# Altium footprint library PCBLIB.PcbLib: 775 footprints (part 7 of 49)
Each footprint in its own frame and in the unit in brackets; x right, y up, seen from the top. Pads: shape width x height; smd on the part's side, far side on the other; paste and mask are expansions set on the pad; w line width, h text height; cw(c..) or ccw(c..) is an arc to the next point about the centre after c.
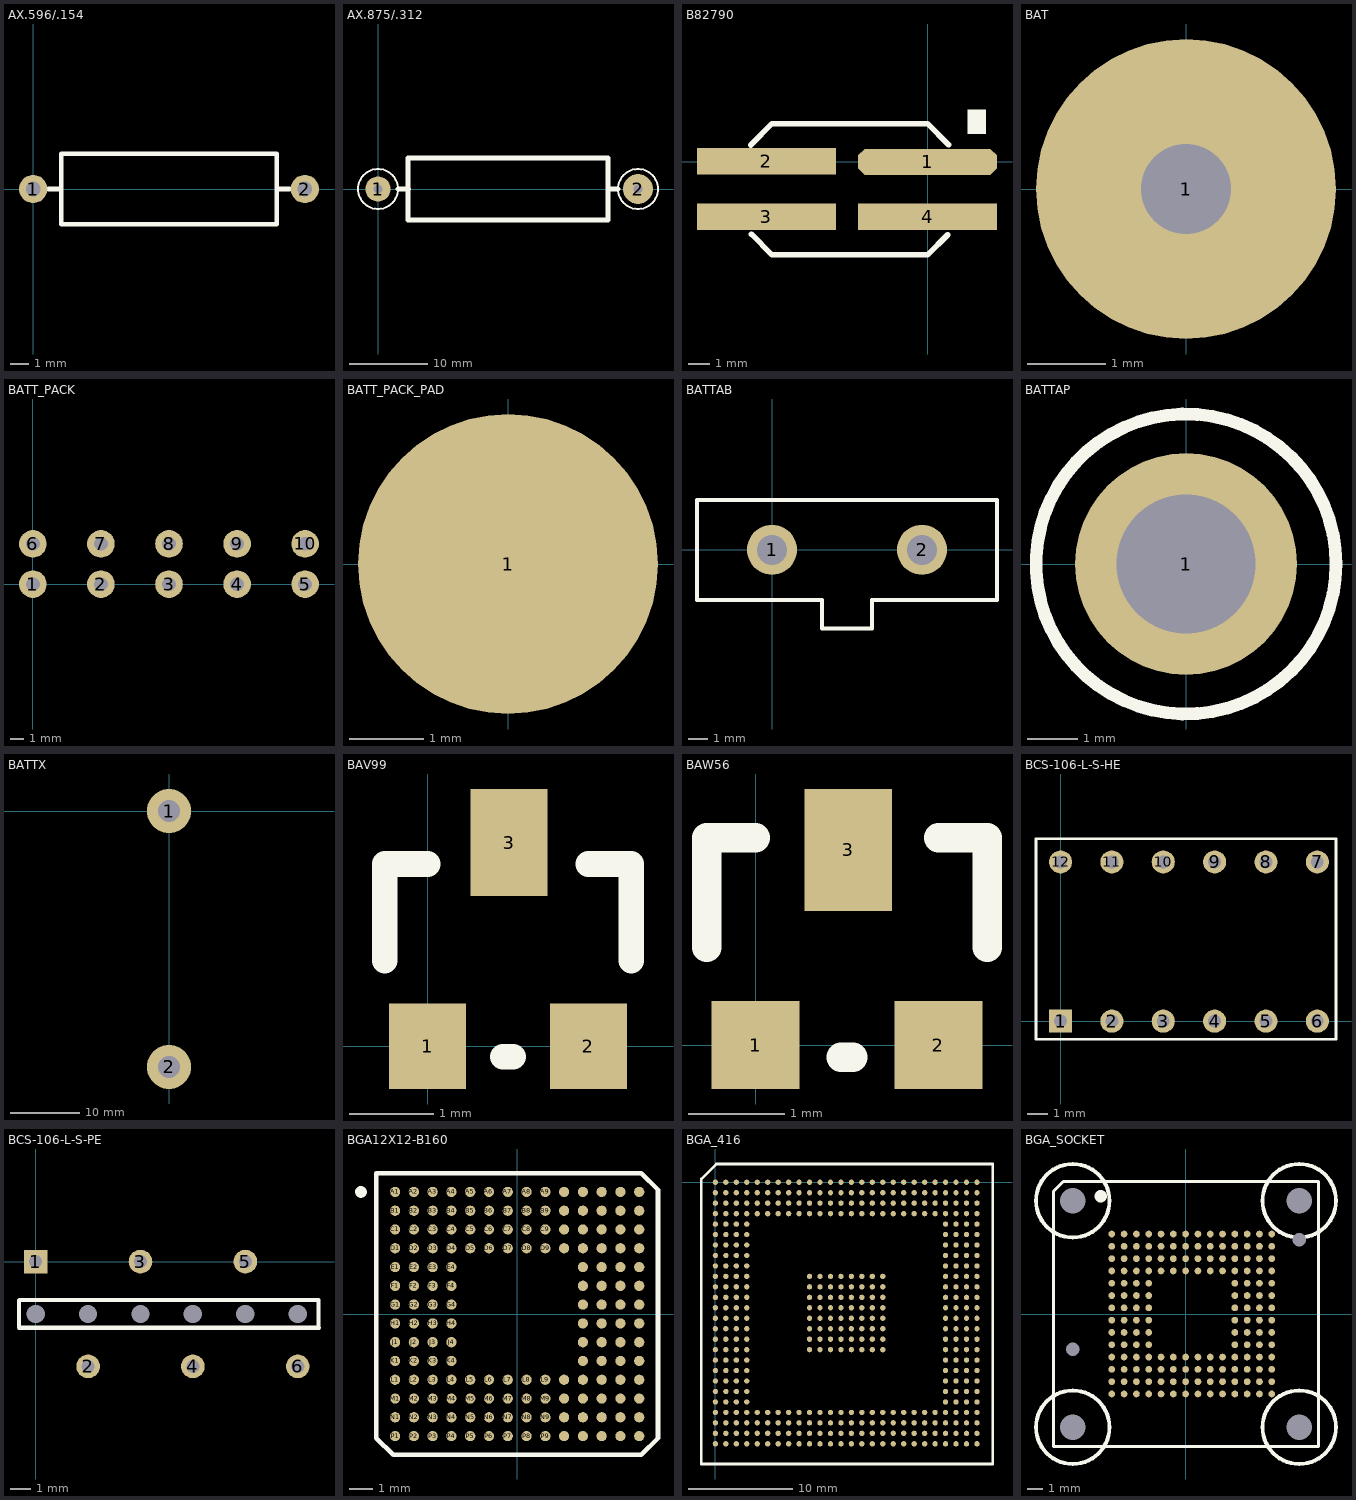
[diagram p6: the footprints below, top view; thin cyan lines are the x and y axes]

## AX.596/.154 [mil]
pads (2):
  round 62 hole 32: 1(0,0) 2(596,0)
TopOverlay:
  lines w10: 33,0 62,0 ; 534,0 563,0 ; 62,0 62,-77 534,-77 534,77 62,77 62,0

## AX.875/.312 [mil]
pads (2):
  round 125.98 hole 47: 1(0,0)
  round 150 hole 47: 2(1300,0)
TopOverlay:
  circle w10: c1300,0 r100
  circle w10: c0,0 r100
  lines w25: 100,0 152.14,0 ; 1150.77,0 1200,0 ; 150,-156 1150,-156 1150,156 150,156 150,-156

## B82790 [mm]
pads (4):
  oct 6.35x1.2 smd: 1(0,0)
  rect 6.35x1.2 smd: 2(-7.36,0.025) 3(-7.36,-2.5) 4(0,-2.5)
TopOverlay:
  rectangle: 1.829,1.269 2.681,2.388
  lines w0.254: -8.077,0.773 -7.1,1.75 0,1.75 0.965,0.785 ; -8.048,-3.302 -7.1,-4.25 0,-4.25 0.923,-3.327

## BAT [mil]
pads (1):
  round 150 hole 45: 1(0,0)

## BATT_PACK [mil]
pads (10):
  round 80 hole 40.16: 1(0,0) 2(197,0) 3(394,0) 4(591,0) 5(788,0) 6(0,117) 7(197,117) 8(394,117) 9(591,117) 10(788,117)

## BATT_PACK_PAD [mil]
pads (1):
  round 160 smd: 1(0,0)

## BATTAB [mil]
pads (2):
  round 100 hole 60: 1(0,0) 2(300,0)
TopOverlay:
  lines w8: -150,-100 -99,-100 100,-100 100,-157 200,-157 200,-100 450,-100 450,100 -150,100 -150,-100
Mechanical4:
  text "1.286" at 0,0 h1

## BATTAP [mil]
pads (1):
  round 175 hole 110: 1(0,0)
TopOverlay:
  circle w10: c0,0 r118.41

## BATTX [mil]
pads (2):
  round 250 hole 125: 1(0,0) 2(0,-1445)
Mechanical4:
  text "1.286" at 0,0 h1

## BAV99 [mil]
pads (3):
  rect 36x40 smd: 1(0,0) 2(75,0)
  rect 36x50 smd: 3(38,95)
TopOverlay:
  lines w12: -20,40 -20,85 0,85 ; 35,-5 40,-5 ; 75,85 95,85 95,40

## BAW56 [mil]
pads (3):
  rect 36x36 smd: 1(0,0) 2(75,0)
  rect 36x50 smd: 3(38,80)
TopOverlay:
  lines w12: -20,40 -20,85 0,85 ; 35,-5 40,-5 ; 75,85 95,85 95,40

## BCS-106-L-S-HE [mil]
height 10
pads (12):
  rect 45x45 hole 25: 1(0,0)
  round 45 hole 25: 2(100,0) 3(200,0) 4(300,0) 5(400,0) 6(500,0) 7(500,310) 8(400,310) 9(300,310) 10(200,310) 11(100,310) 12(0,310)
TopOverlay:
  lines w5: -47.82,355 -47.82,-35 536.37,-35 536.37,355 -46.88,355

## BCS-106-L-S-PE [mil]
height 290.16
pads (12):
  rect 45x45 hole 25: 1(0,0)
  round 45 hole 25: 2(100,-200) 3(200,0) 4(300,-200) 5(400,0) 6(500,-200)
  rect 1x1 hole 35: MH(0,-100)
  round 1 hole 35: MH(100,-100) MH(200,-100) MH(300,-100) MH(400,-100) MH(500,-100)
TopOverlay:
  lines w8: -31.73,-126.39 -31.73,-73.99 -30.88,-73.14 539.64,-73.14 539.64,-125.55 540.48,-126.39 -31.73,-126.39

## BGA12X12-B160 [mm]
height 3.937
pads (160):
  round 0.437 smd: A1(-5.2,5.2) A2(-4.4,5.2) A3(-3.6,5.2) A4(-2.8,5.2) A5(-2,5.2) A6(-1.2,5.2) A7(-0.4,5.2) A8(0.4,5.2) A9(1.2,5.2) A10(2,5.2) A11(2.8,5.2) A12(3.6,5.2) A13(4.4,5.2) A14(5.2,5.2) B1(-5.2,4.4) B2(-4.4,4.4) B3(-3.6,4.4) B4(-2.8,4.4) B5(-2,4.4) B6(-1.2,4.4) B7(-0.4,4.4) B8(0.4,4.4) B9(1.2,4.4) B10(2,4.4) B11(2.8,4.4) B12(3.6,4.4) B13(4.4,4.4) B14(5.2,4.4) C1(-5.2,3.6) C2(-4.4,3.6) C3(-3.6,3.6) C4(-2.8,3.6) C5(-2,3.6) C6(-1.2,3.6) C7(-0.4,3.6) C8(0.4,3.6) C9(1.2,3.6) C10(2,3.6) C11(2.8,3.6) C12(3.6,3.6) C13(4.4,3.6) C14(5.2,3.6) D1(-5.2,2.8) D2(-4.4,2.8) D3(-3.6,2.8) D4(-2.8,2.8) D5(-2,2.8) D6(-1.2,2.8) D7(-0.4,2.8) D8(0.4,2.8) D9(1.2,2.8) D10(2,2.8) D11(2.8,2.8) D12(3.6,2.8) D13(4.4,2.8) D14(5.2,2.8) E1(-5.2,2) E2(-4.4,2) E3(-3.6,2) E4(-2.8,2) E11(2.8,2) E12(3.6,2) E13(4.4,2) E14(5.2,2) F1(-5.2,1.2) F2(-4.4,1.2) F3(-3.6,1.2) F4(-2.8,1.2) F11(2.8,1.2) F12(3.6,1.2) F13(4.4,1.2) F14(5.2,1.2) G1(-5.2,0.4) G2(-4.4,0.4) G3(-3.6,0.4) G4(-2.8,0.4) G11(2.8,0.4) G12(3.6,0.4) G13(4.4,0.4) G14(5.2,0.4) H1(-5.2,-0.4) H2(-4.4,-0.4) H3(-3.6,-0.4) H4(-2.8,-0.4) H11(2.8,-0.4) H12(3.6,-0.4) H13(4.4,-0.4) H14(5.2,-0.4) J1(-5.2,-1.2) J2(-4.4,-1.2) J3(-3.6,-1.2) J4(-2.8,-1.2) J11(2.8,-1.2) J12(3.6,-1.2) J13(4.4,-1.2) J14(5.2,-1.2) K1(-5.2,-2) K2(-4.4,-2) K3(-3.6,-2) K4(-2.8,-2) K11(2.8,-2) K12(3.6,-2) K13(4.4,-2) K14(5.2,-2) L1(-5.2,-2.8) L2(-4.4,-2.8) L3(-3.6,-2.8) L4(-2.8,-2.8) L5(-2,-2.8) L6(-1.2,-2.8) L7(-0.4,-2.8) L8(0.4,-2.8) L9(1.2,-2.8) L10(2,-2.8) L11(2.8,-2.8) L12(3.6,-2.8) L13(4.4,-2.8) L14(5.2,-2.8) M1(-5.2,-3.6) M2(-4.4,-3.6) M3(-3.6,-3.6) M4(-2.8,-3.6) M5(-2,-3.6) M6(-1.2,-3.6) M7(-0.4,-3.6) M8(0.4,-3.6) M9(1.2,-3.6) M10(2,-3.6) M11(2.8,-3.6) M12(3.6,-3.6) M13(4.4,-3.6) M14(5.2,-3.6) N1(-5.2,-4.4) N2(-4.4,-4.4) N3(-3.6,-4.4) N4(-2.8,-4.4) N5(-2,-4.4) N6(-1.2,-4.4) N7(-0.4,-4.4) N8(0.4,-4.4) N9(1.2,-4.4) N10(2,-4.4) N11(2.8,-4.4) N12(3.6,-4.4) N13(4.4,-4.4) N14(5.2,-4.4) P1(-5.2,-5.2) P2(-4.4,-5.2) P3(-3.6,-5.2) P4(-2.8,-5.2) P5(-2,-5.2) P6(-1.2,-5.2) P7(-0.4,-5.2) P8(0.4,-5.2) P9(1.2,-5.2) P10(2,-5.2) P11(2.8,-5.2) P12(3.6,-5.2) P13(4.4,-5.2) P14(5.2,-5.2)
TopOverlay:
  circle w0.25: c-6.655,5.2 r0.125
  lines w0.2: -6,-5.284 -6,6 5.284,6 6,5.284 6,-5.284 5.284,-6 -5.284,-6 -6,-5.284

## BGA_416 [mil]
height 10
pads (416):
  round 20 smd: A1(0.34,0.29) A2(39.71,0.29) A3(79.08,0.29) A4(118.45,0.29) A5(157.82,0.29) A6(197.19,0.29) A7(236.56,0.29) A8(275.93,0.29) A9(315.3,0.29) A10(354.67,0.29) A11(394.04,0.29) A12(433.41,0.29) A13(472.78,0.29) A14(512.15,0.29) A15(551.52,0.29) A16(590.89,0.29) A17(630.26,0.29) A18(669.63,0.29) A19(709,0.29) A20(748.37,0.29) A21(787.74,0.29) A22(827.11,0.29) A23(866.48,0.29) A24(905.85,0.29) A25(945.22,0.29) A26(984.59,0.29) AA1(0.34,-787.11) AA2(39.71,-787.11) AA3(79.08,-787.11) AA4(118.45,-787.11) AA23(866.48,-787.11) AA24(905.85,-787.11) AA25(945.22,-787.11) AA26(984.59,-787.11) AB1(0.34,-826.48) AB2(39.71,-826.48) AB3(79.08,-826.48) AB4(118.45,-826.48) AB23(866.48,-826.48) AB24(905.85,-826.48) AB25(945.22,-826.48) AB26(984.59,-826.48) AC1(0.34,-865.85) AC2(39.71,-865.85) AC3(79.08,-865.85) AC4(118.45,-865.85) AC5(157.82,-865.85) AC6(197.19,-865.85) AC7(236.56,-865.85) AC8(275.93,-865.85) AC9(315.3,-865.85) AC10(354.67,-865.85) AC11(394.04,-865.85) AC12(433.41,-865.85) AC13(472.78,-865.85) AC14(512.15,-865.85) AC15(551.52,-865.85) AC16(590.89,-865.85) AC17(630.26,-865.85) AC18(669.63,-865.85) AC19(709,-865.85) AC20(748.37,-865.85) AC21(787.74,-865.85) AC22(827.11,-865.85) AC23(866.48,-865.85) AC24(905.85,-865.85) AC25(945.22,-865.85) AC26(984.59,-865.85) AD1(0.34,-905.22) AD2(39.71,-905.22) AD3(79.08,-905.22) AD4(118.45,-905.22) AD5(157.82,-905.22) AD6(197.19,-905.22) AD7(236.56,-905.22) AD8(275.93,-905.22) AD9(315.3,-905.22) AD10(354.67,-905.22) AD11(394.04,-905.22) AD12(433.41,-905.22) AD13(472.78,-905.22) AD14(512.15,-905.22) AD15(551.52,-905.22) AD16(590.89,-905.22) AD17(630.26,-905.22) AD18(669.63,-905.22) AD19(709,-905.22) AD20(748.37,-905.22) AD21(787.74,-905.22) AD22(827.11,-905.22) AD23(866.48,-905.22) AD24(905.85,-905.22) AD25(945.22,-905.22) AD26(984.59,-905.22) AE1(0.34,-944.59) AE2(39.71,-944.59) AE3(79.08,-944.59) AE4(118.45,-944.59) AE5(157.82,-944.59) AE6(197.19,-944.59) AE7(236.56,-944.59) AE8(275.93,-944.59) AE9(315.3,-944.59) AE10(354.67,-944.59) AE11(394.04,-944.59) AE12(433.41,-944.59) AE13(472.78,-944.59) AE14(512.15,-944.59) AE15(551.52,-944.59) AE16(590.89,-944.59) AE17(630.26,-944.59) AE18(669.63,-944.59) AE19(709,-944.59) AE20(748.37,-944.59) AE21(787.74,-944.59) AE22(827.11,-944.59) AE23(866.48,-944.59) AE24(905.85,-944.59) AE25(945.22,-944.59) AE26(984.59,-944.59) AF1(0.34,-983.96) AF2(39.71,-983.96) AF3(79.08,-983.96) AF4(118.45,-983.96) AF5(157.82,-983.96) AF6(197.19,-983.96) AF7(236.56,-983.96) AF8(275.93,-983.96) AF9(315.3,-983.96) AF10(354.67,-983.96) AF11(394.04,-983.96) AF12(433.41,-983.96) AF13(472.78,-983.96) AF14(512.15,-983.96) AF15(551.52,-983.96) AF16(590.89,-983.96) AF17(630.26,-983.96) AF18(669.63,-983.96) AF19(709,-983.96) AF20(748.37,-983.96) AF21(787.74,-983.96) AF22(827.11,-983.96) AF23(866.48,-983.96) AF24(905.85,-983.96) AF25(945.22,-983.96) AF26(984.59,-983.96) B1(0.34,-39.08) B2(39.71,-39.08) B3(79.08,-39.08) B4(118.45,-39.08) B5(157.82,-39.08) B6(197.19,-39.08) B7(236.56,-39.08) B8(275.93,-39.08) B9(315.3,-39.08) B10(354.67,-39.08) B11(394.04,-39.08) B12(433.41,-39.08) B13(472.78,-39.08) B14(512.15,-39.08) B15(551.52,-39.08) B16(590.89,-39.08) B17(630.26,-39.08) B18(669.63,-39.08) B19(709,-39.08) B20(748.37,-39.08) B21(787.74,-39.08) B22(827.11,-39.08) B23(866.48,-39.08) B24(905.85,-39.08) B25(945.22,-39.08) B26(984.59,-39.08) C1(0.34,-78.45) C2(39.71,-78.45) C3(79.08,-78.45) C4(118.45,-78.45) C5(157.82,-78.45) C6(197.19,-78.45) C7(236.56,-78.45) C8(275.93,-78.45) C9(315.3,-78.45) C10(354.67,-78.45) C11(394.04,-78.45) C12(433.41,-78.45) C13(472.78,-78.45) C14(512.15,-78.45) C15(551.52,-78.45) C16(590.89,-78.45) C17(630.26,-78.45) C18(669.63,-78.45) C19(709,-78.45) C20(748.37,-78.45) C21(787.74,-78.45) C22(827.11,-78.45) C23(866.48,-78.45) C24(905.85,-78.45) C25(945.22,-78.45) C26(984.59,-78.45) D1(0.34,-117.82) D2(39.71,-117.82) D3(79.08,-117.82) D4(118.45,-117.82) D5(157.82,-117.82) D6(197.19,-117.82) D7(236.56,-117.82) D8(275.93,-117.82) D9(315.3,-117.82) D10(354.67,-117.82) D11(394.04,-117.82) D12(433.41,-117.82) D13(472.78,-117.82) D14(512.15,-117.82) D15(551.52,-117.82) D16(590.89,-117.82) D17(630.26,-117.82) D18(669.63,-117.82) D19(709,-117.82) D20(748.37,-117.82) D21(787.74,-117.82) D22(827.11,-117.82) D23(866.48,-117.82) D24(905.85,-117.82) D25(945.22,-117.82) D26(984.59,-117.82) E1(0.34,-157.19) E2(39.71,-157.19) E3(79.08,-157.19) E4(118.45,-157.19) E23(866.48,-157.19) E24(905.85,-157.19) E25(945.22,-157.19) E26(984.59,-157.19) F1(0.34,-196.56) F2(39.71,-196.56) F3(79.08,-196.56) F4(118.45,-196.56) F23(866.48,-196.56) F24(905.85,-196.56) F25(945.22,-196.56) F26(984.59,-196.56) G1(0.34,-235.93) G2(39.71,-235.93) G3(79.08,-235.93) G4(118.45,-235.93) G23(866.48,-235.93) G24(905.85,-235.93) G25(945.22,-235.93) G26(984.59,-235.93) H1(0.34,-275.3) H2(39.71,-275.3) H3(79.08,-275.3) H4(118.45,-275.3) H23(866.48,-275.3) H24(905.85,-275.3) H25(945.22,-275.3) H26(984.59,-275.3) J1(0.34,-314.67) J2(39.71,-314.67) J3(79.08,-314.67) J4(118.45,-314.67) J23(866.48,-314.67) J24(905.85,-314.67) J25(945.22,-314.67) J26(984.59,-314.67) K1(0.34,-354.04) K2(39.71,-354.04) K3(79.08,-354.04) K4(118.45,-354.04) K10(354.67,-354.04) K11(394.04,-354.04) K12(433.41,-354.04) K13(472.78,-354.04) K14(512.15,-354.04) K15(551.52,-354.04) K16(590.89,-354.04) K17(630.26,-354.04) K23(866.48,-354.04) K24(905.85,-354.04) K25(945.22,-354.04) K26(984.59,-354.04) L1(0.34,-393.41) L2(39.71,-393.41) L3(79.08,-393.41) L4(118.45,-393.41) L10(354.67,-393.41) L11(394.04,-393.41) L12(433.41,-393.41) L13(472.94,-393.44) L14(512.15,-393.41) L15(551.52,-393.41) L16(590.89,-393.41) L17(630.26,-393.41) L23(866.48,-393.41) L24(905.85,-393.41) L25(945.22,-393.41) L26(984.59,-393.41) M1(0.34,-432.78) M2(39.71,-432.78) M3(79.08,-432.78) M4(118.45,-432.78) M10(354.67,-432.78) M11(394.04,-432.78) M12(433.41,-432.78) M13(472.78,-432.78) M14(512.15,-432.78) M15(551.52,-432.78) M16(590.89,-432.78) M17(630.26,-432.78) M23(866.48,-432.78) M24(905.85,-432.78) M25(945.22,-432.78) M26(984.59,-432.78) N1(0.34,-472.15) N2(39.71,-472.15) N3(79.08,-472.15) N4(118.45,-472.15) N10(354.67,-472.15) N11(394.04,-472.15) N12(433.41,-472.15) N13(472.78,-472.15) N14(512.15,-472.15) N15(551.52,-472.15) N16(590.89,-472.15) N17(630.26,-472.15) N23(866.48,-472.15) N24(905.85,-472.15) N25(945.22,-472.15) N26(984.59,-472.15) P1(0.34,-511.52) P2(39.71,-511.52) P3(79.08,-511.52) P4(118.45,-511.52) P10(354.67,-511.52) P11(394.04,-511.52) P12(433.41,-511.52) P13(472.78,-511.52) P14(512.15,-511.52) P15(551.52,-511.52) P16(590.89,-511.52) P17(630.26,-511.52) P23(866.48,-511.52) P24(905.85,-511.52) P25(945.22,-511.52) P26(984.59,-511.52) R1(0.34,-550.89) R2(39.71,-550.89) R3(79.08,-550.89) R4(118.45,-550.89) R10(354.67,-550.89) R11(394.04,-550.89) R12(433.41,-550.89) R13(472.78,-550.89) R14(512.15,-550.89) R15(551.52,-550.89) R16(590.89,-550.89) R17(630.26,-550.89) R23(866.48,-550.89) R24(905.85,-550.89) R25(945.22,-550.89) R26(984.59,-550.89) T1(0.34,-590.26) T2(39.71,-590.26) T3(79.08,-590.26) T4(118.45,-590.26) T10(354.67,-590.26) T11(394.04,-590.26) T12(433.41,-590.26) T13(472.78,-590.26) T14(512.15,-590.26) T15(551.52,-590.26) T16(590.89,-590.26) T17(630.26,-590.26) T23(866.48,-590.26) T24(905.85,-590.26) T25(945.22,-590.26) T26(984.59,-590.26) U1(0.34,-629.63) U2(39.71,-629.63) U3(79.08,-629.63) U4(118.45,-629.63) U10(354.67,-629.63) U11(394.04,-629.63) U12(433.41,-629.63) U13(472.78,-629.63) U14(512.15,-629.63) U15(551.52,-629.63) U16(590.89,-629.63) U17(630.26,-629.63) U23(866.48,-629.63) U24(905.85,-629.63) U25(945.22,-629.63) U26(984.59,-629.63) V1(0.34,-669) V2(39.71,-669) V3(79.08,-669) V4(118.45,-669) V23(866.48,-669) V24(905.85,-669) V25(945.22,-669) V26(984.59,-669) W1(0.34,-708.37) W2(39.71,-708.37) W3(79.08,-708.37) W4(118.45,-708.37) W23(866.48,-708.37) W24(905.85,-708.37) W25(945.22,-708.37) W26(984.59,-708.37) Y1(0.34,-747.74) Y2(39.71,-747.74) Y3(79.08,-747.74) Y4(118.45,-747.74) Y23(866.48,-747.74) Y24(905.85,-747.74) Y25(945.22,-747.74) Y26(984.59,-747.74)
TopOverlay:
  lines w10: -52.47,-1059.98 -52.47,12.8 3.68,68.95 1043.68,68.95 1043.68,-1059.98 -52.47,-1059.98
  text "." at -71.58,56.7 h250
BottomOverlay:
  text "AE" at 1067.92,-964.6 h30
  text "AD" at 1065.99,-926.03 h30
  text "AC" at 1066.96,-886.5 h30
  text "AB" at 1068.89,-848.9 h30
  text "AA" at 1068.89,-811.29 h30
  text "Y" at 1070.81,-772.73 h30
  text "W" at 1069.85,-732.23 h30
  text "V" at 1067.92,-690.77 h30
  text "U" at 1075.63,-652.2 h30
  text "T" at 1067.92,-611.71 h30
  text "R" at 1068.89,-574.1 h30
  text "P" at 1071.78,-533.61 h30
  text "N" at 1070.81,-496 h30
  text "M" at 1068.89,-453.58 h30
  text "L" at 1069.85,-413.08 h30
  text "K" at 1071.78,-373.55 h30
  text "J" at 1068.89,-334.02 h30
  text "H" at 1073.71,-288.7 h30
  text "G" at 1075.63,-253.03 h30
  text "F" at 1075.63,-215.42 h30
  text "E" at 1077.56,-173 h30
  text "D" at 1073.71,-134.43 h30
  text "C" at 1076.6,-92.01 h30
  text "B" at 1077.56,-51.51 h30
  text "A" at 1079.49,-10.05 h30
  text "AF" at 1067.92,-1001.24 h30
  text "26" at 1005.16,-1009.99 h30
  text "25" at 965.16,-1009.99 h30
  text "24" at 925.16,-1009.99 h30
  text "23" at 885.16,-1009.99 h30
  text "22" at 845.16,-1009.99 h30
  text "21" at 805.16,-1009.99 h30
  text "20" at 765.16,-1009.99 h30
  text "19" at 725.16,-1009.99 h30
  text "17" at 645.16,-1009.99 h30
  text "18" at 685.16,-1009.99 h30
  text "16" at 605.16,-1009.99 h30
  text "15" at 565.16,-1009.99 h30
  text "14" at 525.16,-1009.99 h30
  text "13" at 485.16,-1009.99 h30
  text "12" at 445.16,-1009.99 h30
  text "11" at 405.16,-1009.99 h30
  text "10" at 365.16,-1009.99 h30
  text "9" at 325.16,-1009.99 h30
  text "8" at 285.16,-1009.99 h30
  text "7" at 245.16,-1009.99 h30
  text "6" at 205.16,-1009.99 h30
  text "5" at 165.16,-1009.99 h30
  text "4" at 135.16,-1009.99 h30
  text "3" at 95.16,-1009.99 h30
  text "2" at 55.16,-1009.99 h30
  text "1" at 15.16,-1010.26 h30
  text "AF" at -39.93,-996.42 h30
  text "A" at -28.36,-5.23 h30
  text "B" at -30.29,-46.69 h30
  text "C" at -31.25,-87.18 h30
  text "D" at -34.15,-129.61 h30
  text "E" at -30.29,-168.18 h30
  text "F" at -32.22,-210.6 h30
  text "G" at -32.22,-248.2 h30
  text "H" at -34.15,-283.88 h30
  text "J" at -38.97,-329.2 h30
  text "K" at -36.08,-368.73 h30
  text "L" at -38,-408.26 h30
  text "M" at -38.97,-448.76 h30
  text "N" at -37.04,-491.18 h30
  text "P" at -36.08,-528.78 h30
  text "R" at -38.97,-569.28 h30
  text "T" at -39.93,-606.88 h30
  text "U" at -32.22,-647.38 h30
  text "V" at -39.93,-685.95 h30
  text "W" at -38,-727.41 h30
  text "Y" at -37.04,-767.9 h30
  text "AA" at -38.97,-806.47 h30
  text "AB" at -38.97,-844.07 h30
  text "AC" at -40.9,-881.68 h30
  text "AD" at -41.86,-921.21 h30
  text "AE" at -39.93,-959.78 h30
  text "1" at 16.84,75.12 h30
  text "2" at 56.84,75.4 h30
  text "3" at 96.83,75.4 h30
  text "4" at 136.84,75.4 h30
  text "5" at 166.84,75.4 h30
  text "6" at 206.84,75.4 h30
  text "7" at 246.84,75.4 h30
  text "8" at 286.83,75.4 h30
  text "9" at 326.83,75.4 h30
  text "10" at 366.83,75.4 h30
  text "11" at 406.83,75.4 h30
  text "12" at 446.83,75.4 h30
  text "13" at 486.83,75.4 h30
  text "14" at 526.84,75.4 h30
  text "15" at 566.84,75.4 h30
  text "16" at 606.84,75.4 h30
  text "18" at 686.84,75.4 h30
  text "17" at 646.84,75.4 h30
  text "19" at 726.84,75.4 h30
  text "20" at 766.84,75.4 h30
  text "21" at 806.84,75.4 h30
  text "22" at 846.84,75.4 h30
  text "23" at 886.84,75.4 h30
  text "24" at 926.84,75.4 h30
  text "25" at 966.84,75.4 h30
  text "26" at 1006.84,75.4 h30

## BGA_SOCKET [mm]
pads (166):
  round 0.1 hole 1.63: 0(-7.338,-7.362) 0(-7.338,7.363) 0(7.387,-7.362) 0(7.387,7.363)
  round 0.1 hole 0.87: 0(-7.338,-2.282) 0(7.387,4.823)
  round 0.437 smd: A1(-4.8,5.2) A2(-4,5.2) A3(-3.2,5.2) A4(-2.4,5.2) A5(-1.6,5.2) A6(-0.8,5.2) A7(0,5.2) A8(0.8,5.2) A9(1.6,5.2) A10(2.4,5.2) A11(3.2,5.2) A12(4,5.2) A13(4.8,5.2) A14(5.6,5.2) B1(-4.8,4.4) B2(-4,4.4) B3(-3.2,4.4) B4(-2.4,4.4) B5(-1.6,4.4) B6(-0.8,4.4) B7(0,4.4) B8(0.8,4.4) B9(1.6,4.4) B10(2.4,4.4) B11(3.2,4.4) B12(4,4.4) B13(4.8,4.4) B14(5.6,4.4) C1(-4.8,3.6) C2(-4,3.6) C3(-3.2,3.6) C4(-2.4,3.6) C5(-1.6,3.6) C6(-0.8,3.6) C7(0,3.6) C8(0.8,3.6) C9(1.6,3.6) C10(2.4,3.6) C11(3.2,3.6) C12(4,3.6) C13(4.8,3.6) C14(5.6,3.6) D1(-4.8,2.8) D2(-4,2.8) D3(-3.2,2.8) D4(-2.4,2.8) D5(-1.6,2.8) D6(-0.8,2.8) D7(0,2.8) D8(0.8,2.8) D9(1.6,2.8) D10(2.4,2.8) D11(3.2,2.8) D12(4,2.8) D13(4.8,2.8) D14(5.6,2.8) E1(-4.8,2) E2(-4,2) E3(-3.2,2) E4(-2.4,2) E11(3.2,2) E12(4,2) E13(4.8,2) E14(5.6,2) F1(-4.8,1.2) F2(-4,1.2) F3(-3.2,1.2) F4(-2.4,1.2) F11(3.2,1.2) F12(4,1.2) F13(4.8,1.2) F14(5.6,1.2) G1(-4.8,0.4) G2(-4,0.4) G3(-3.2,0.4) G4(-2.4,0.4) G11(3.2,0.4) G12(4,0.4) G13(4.8,0.4) G14(5.6,0.4) H1(-4.8,-0.4) H2(-4,-0.4) H3(-3.2,-0.4) H4(-2.4,-0.4) H11(3.2,-0.4) H12(4,-0.4) H13(4.8,-0.4) H14(5.6,-0.4) J1(-4.8,-1.2) J2(-4,-1.2) J3(-3.2,-1.2) J4(-2.4,-1.2) J11(3.2,-1.2) J12(4,-1.2) J13(4.8,-1.2) J14(5.6,-1.2) K1(-4.8,-2) K2(-4,-2) K3(-3.2,-2) K4(-2.4,-2) K11(3.2,-2) K12(4,-2) K13(4.8,-2) K14(5.6,-2) L1(-4.8,-2.8) L2(-4,-2.8) L3(-3.2,-2.8) L4(-2.4,-2.8) L5(-1.6,-2.8) L6(-0.8,-2.8) L7(0,-2.8) L8(0.8,-2.8) L9(1.6,-2.8) L10(2.4,-2.8) L11(3.2,-2.8) L12(4,-2.8) L13(4.8,-2.8) L14(5.6,-2.8) M1(-4.8,-3.6) M2(-4,-3.6) M3(-3.2,-3.6) M4(-2.4,-3.6) M5(-1.6,-3.6) M6(-0.8,-3.6) M7(0,-3.6) M8(0.8,-3.6) M9(1.6,-3.6) M10(2.4,-3.6) M11(3.2,-3.6) M12(4,-3.6) M13(4.8,-3.6) M14(5.6,-3.6) N1(-4.8,-4.4) N2(-4,-4.4) N3(-3.2,-4.4) N4(-2.4,-4.4) N5(-1.6,-4.4) N6(-0.8,-4.4) N7(0,-4.4) N8(0.8,-4.4) N9(1.6,-4.4) N10(2.4,-4.4) N11(3.2,-4.4) N12(4,-4.4) N13(4.8,-4.4) N14(5.6,-4.4) P1(-4.8,-5.2) P2(-4,-5.2) P3(-3.2,-5.2) P4(-2.4,-5.2) P5(-1.6,-5.2) P6(-0.8,-5.2) P7(0,-5.2) P8(0.8,-5.2) P9(1.6,-5.2) P10(2.4,-5.2) P11(3.2,-5.2) P12(4,-5.2) P13(4.8,-5.2) P14(5.6,-5.2)
TopOverlay:
  circle w0.4: c-5.522,7.655 r0.2
  circle w0.254: c7.387,7.363 r2.39
  circle w0.254: c-7.338,7.363 r2.39
  circle w0.254: c-7.338,-7.362 r2.39
  circle w0.254: c7.387,-7.362 r2.39
  lines w0.203: -8.588,-8.612 8.637,-8.612 8.637,8.613 -7.95,8.613 -8.588,7.975 -8.588,-8.612
BottomOverlay:
  circle w0.254: c-7.338,-7.362 r2.39
  circle w0.254: c7.387,-7.362 r2.39
  circle w0.254: c7.387,7.363 r2.39
  circle w0.254: c-7.338,7.363 r2.39